# Altium schematic symbol library Wurth_Elektronik_Passive_rev16a.SCHLIB: 1143 symbols (part 12 of 27)
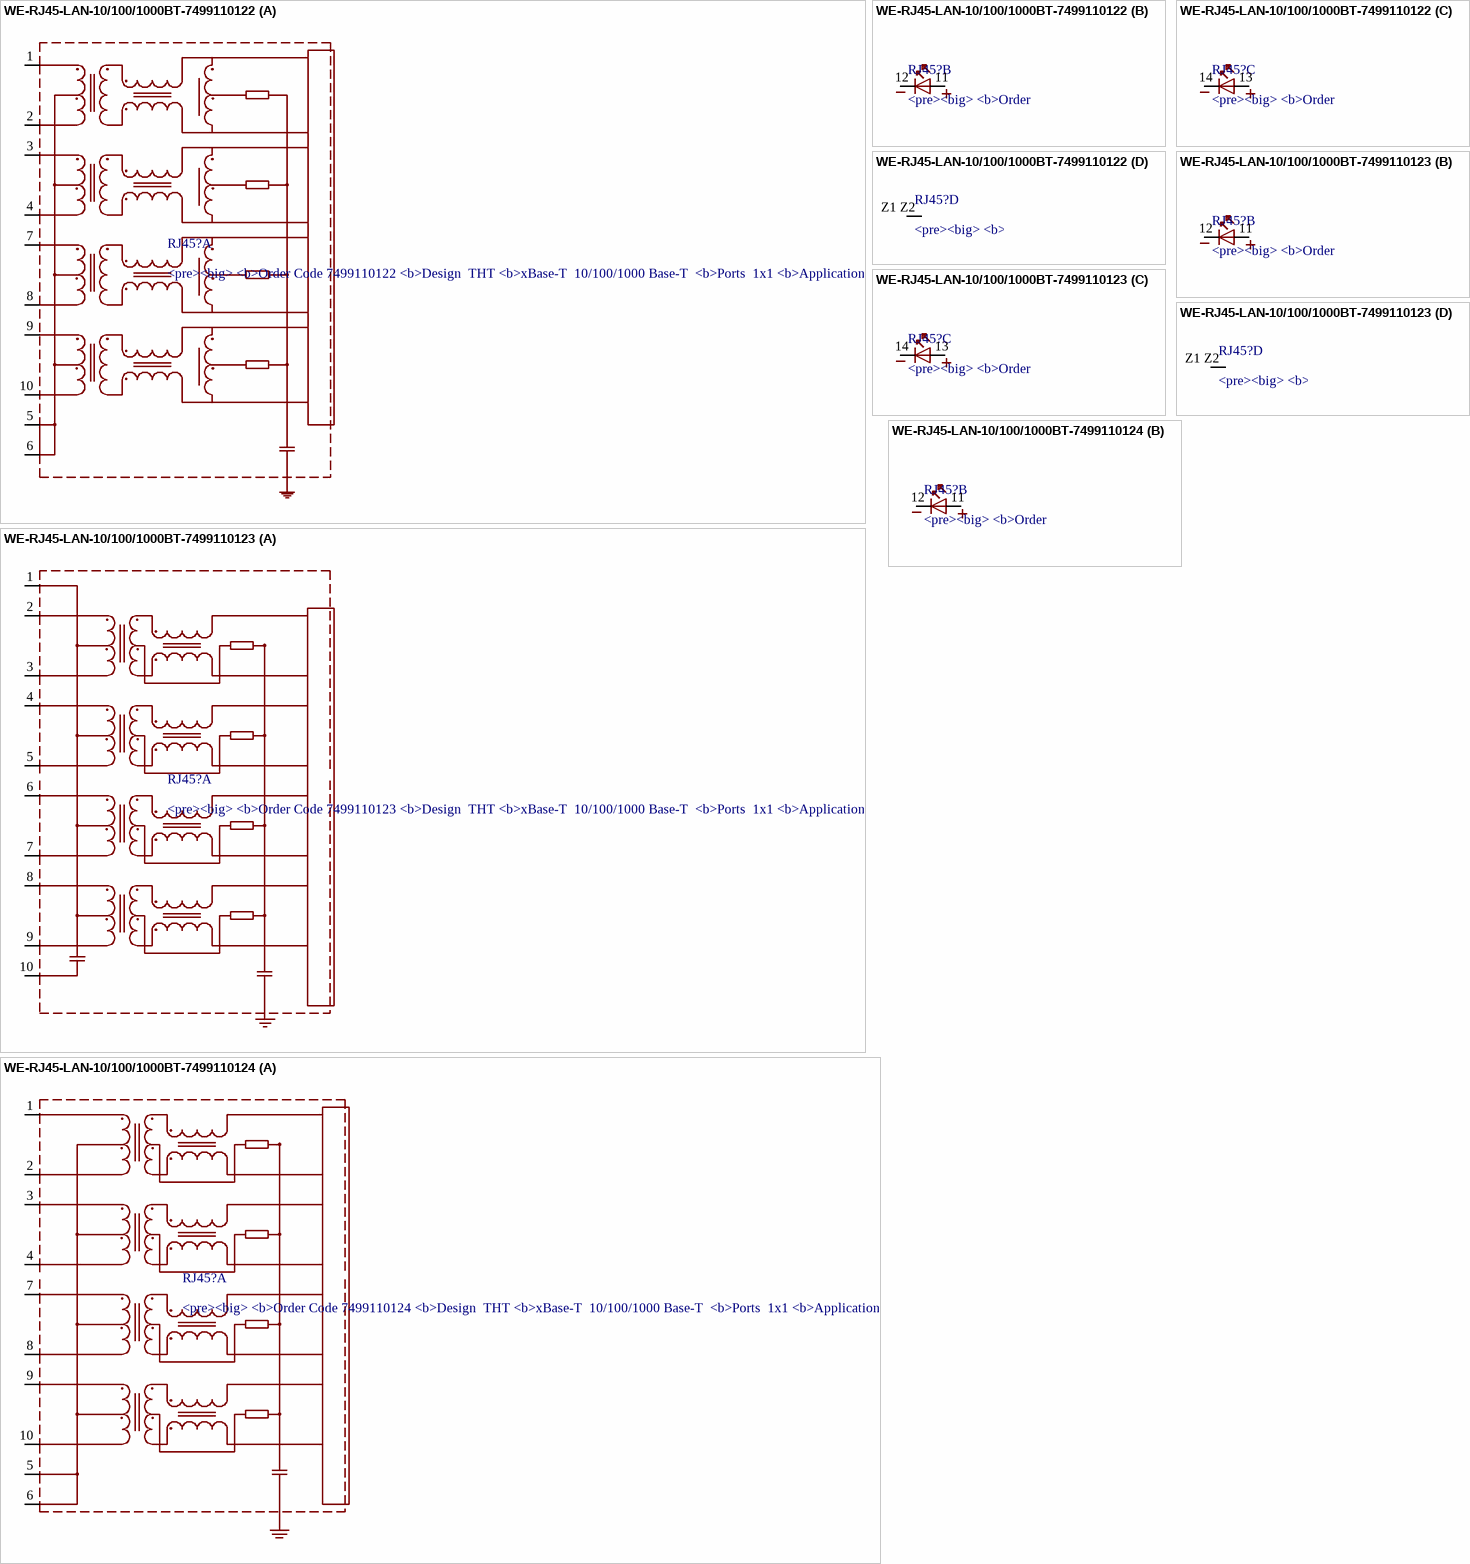
[diagram p69: symbols WE-RJ45-LAN-10/100/1000BT-7499110122 to WE-RJ45-LAN-10/100/1000BT-7499110124]

## WE-RJ45-LAN-10/100/1000BT-7499110122
designator RJ45?, comment <pre><big> / <b>Order Code	7499110122 / <b>Design		THT / <b>xBase-T		10/100/1000 Base-T / <b>Ports		1x1 / <b>Application	Standard / <b>Tab Position	Down / <b>LED (Left-Right)	YELLOW-GREEN / <b>EMI Fingers	No / </b><br><a href="<br><a href="http://katalog.we-online.de/media/images/eisos/UtLAN_RJ45_pf2.jpg" title="Enlarge picture"> / <img src="http://katalog.we-online.de/media/images/eisos/UtLAN_RJ45_pf2.jpg" width="320"></a><p> / Details see: <a href="http://katalog.we-online.de/en/pbs/WE-LAN_RJ45/7499110122?">http://katalog.we-online.de/en/pbs/WE-LAN_RJ45/7499110122?</a><p> / </b> / </b>Updated  by  Dan Xu 2014-07-10<br> / </b>2014 (C) Würth Elektronik
MANUFACTURER: Würth Elektronik eiSos GmbH; CREATED-BY: Christin Zierenner; COMPANY-URL: http://www.we-online.de; CREATED-DATE: AUG 2012; DATASHEET-URL: http://katalog.we-online.de/kataloge/eisos/media/pdf/7499110122.pdf
footprint 7499110122
part A pins: 1, 2, 3, 4, 5, 6, 7, 8, 9, 10
part B pins: 11 A, 12 K
part C pins: 13 A, 14 K
part D pins: Z1 Z2 P$1 (power)

## WE-RJ45-LAN-10/100/1000BT-7499110123
designator RJ45?, comment <pre><big> / <b>Order Code	7499110123 / <b>Design		THT / <b>xBase-T		10/100/1000 Base-T / <b>Ports		1x1 / <b>Application	Standard / <b>Tab Position	VERTICAL / <b>LED (Left-Right)	YELLOW-GREEN / <b>EMI Fingers	No / </b><br><a href="<br><a href="http://katalog.we-online.de/media/images/eisos/UtLAN_RJ45_pf2.jpg" title="Enlarge picture"> / <img src="http://katalog.we-online.de/media/images/eisos/UtLAN_RJ45_pf2.jpg" width="320"></a><p> / Details see: <a href="http://katalog.we-online.de/en/pbs/WE-LAN_RJ45/7499110123?">http://katalog.we-online.de/en/pbs/WE-LAN_RJ45/7499110123?</a><p> / </b> / </b>Updated  by  Dan Xu 2014-07-10<br> / </b>2014 (C) Würth Elektronik
MANUFACTURER: Würth Elektronik eiSos GmbH; CREATED-BY: Christin Zierenner; COMPANY-URL: http://www.we-online.de; CREATED-DATE: AUG 2012; DATASHEET-URL: http://katalog.we-online.de/kataloge/eisos/media/pdf/7499110123.pdf
footprint 7499110123
part A pins: 1, 2, 3, 4, 5, 6, 7, 8, 9, 10
part B pins: 11 A, 12 K
part C pins: 13 A, 14 K
part D pins: Z1 Z2 P$1 (power)

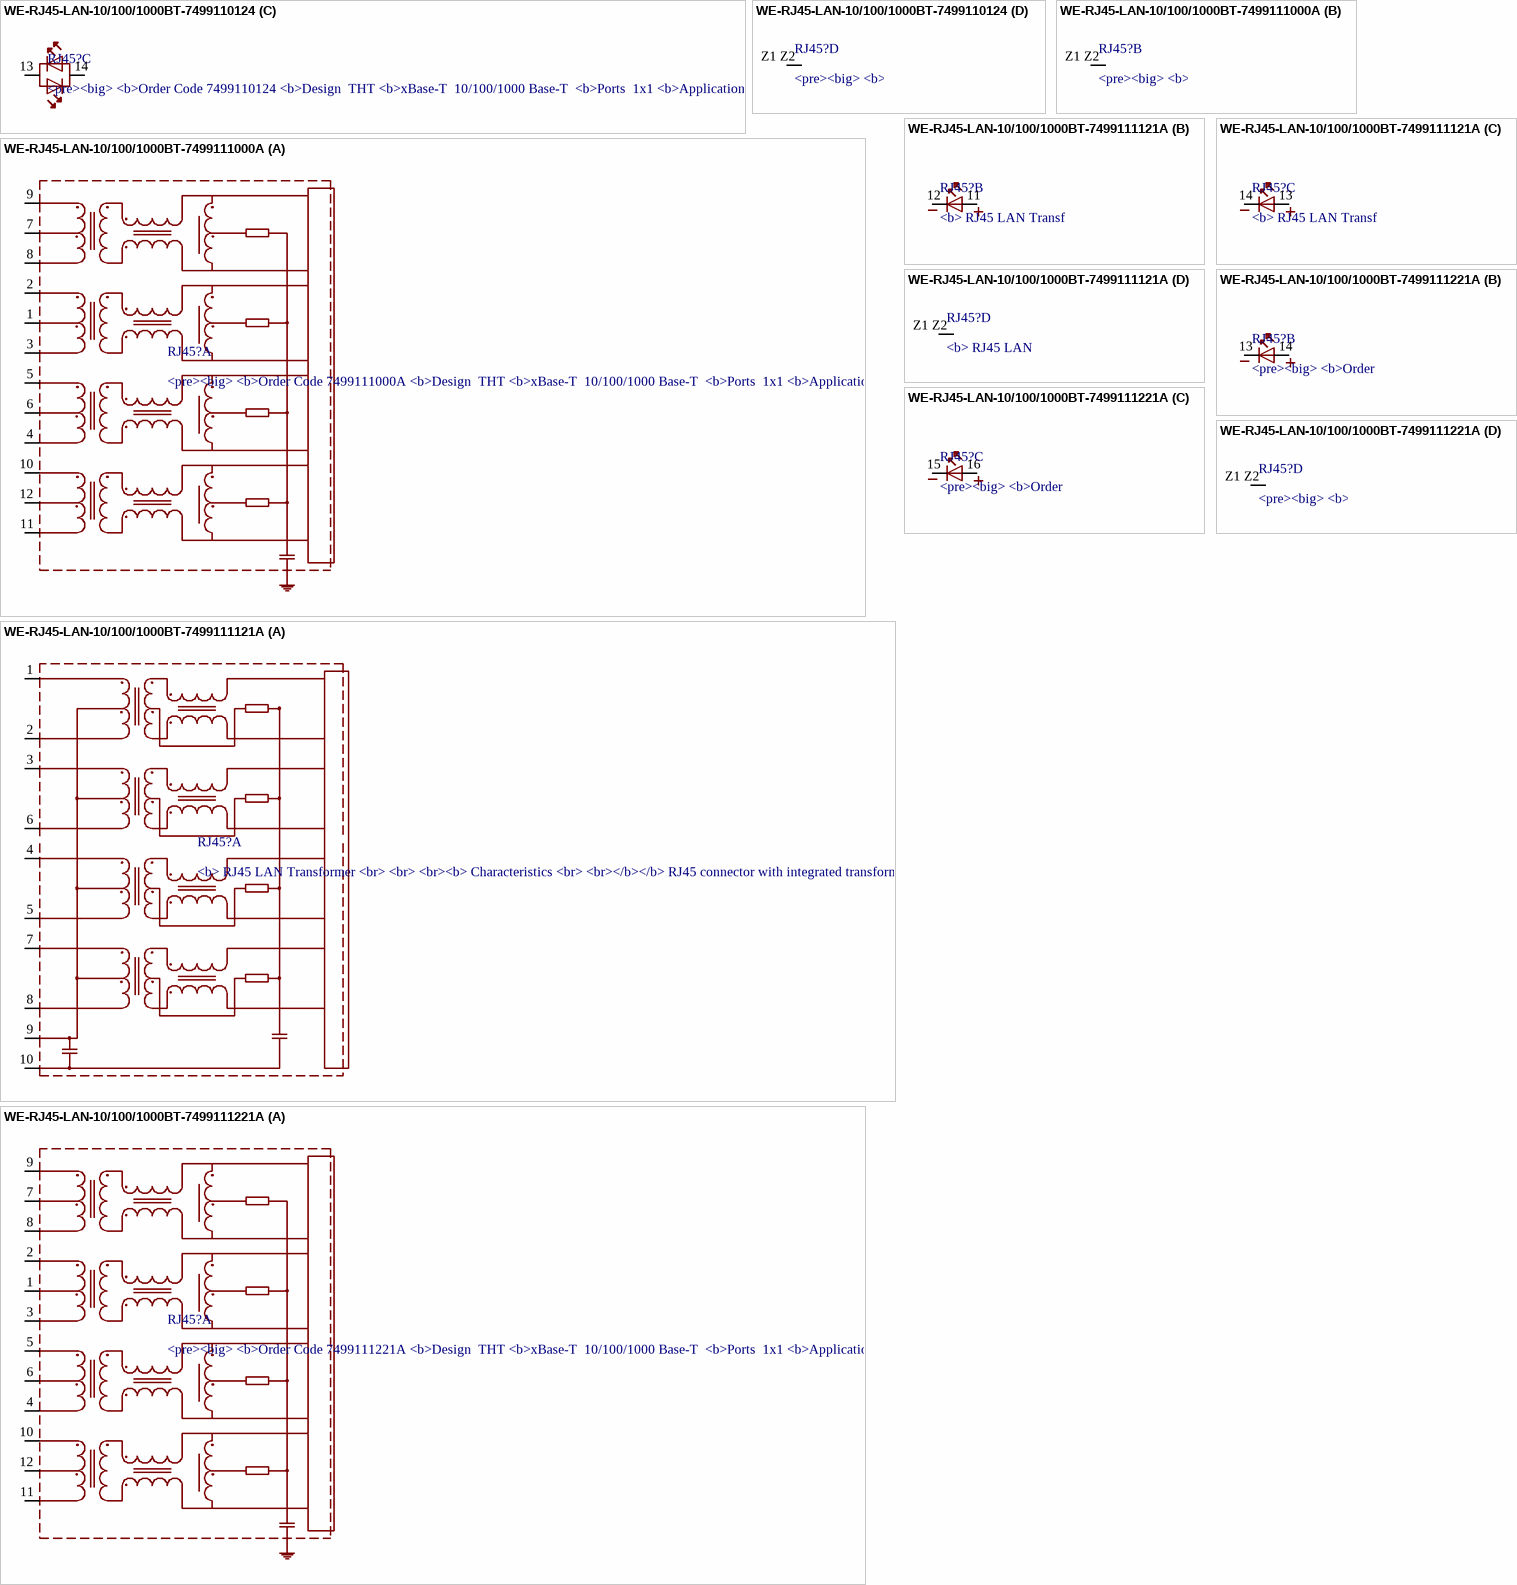
[diagram p29: symbols WE-RJ45-LAN-10/100/1000BT-7499110124 to WE-RJ45-LAN-10/100/1000BT-7499111221A]

## WE-RJ45-LAN-10/100/1000BT-7499110124
designator RJ45?, comment <pre><big> / <b>Order Code	7499110124 / <b>Design		THT / <b>xBase-T		10/100/1000 Base-T / <b>Ports		1x1 / <b>Application	Standard / <b>Tab Position	UP / <b>LED (Left-Right)	GREEN/YELLOW-GREEN / <b>EMI Fingers	No / </b><br><a href="<br><a href="http://katalog.we-online.de/media/images/eisos/UtLAN_RJ45_pf2.jpg" title="Enlarge picture"> / <img src="http://katalog.we-online.de/media/images/eisos/UtLAN_RJ45_pf2.jpg" width="320"></a><p> / Details see: <a href="http://katalog.we-online.de/en/pbs/WE-LAN_RJ45/7499110124?">http://katalog.we-online.de/en/pbs/WE-LAN_RJ45/7499110124?</a><p> / </b> / </b>Updated  by  Dan Xu 2014-07-10<br> / </b>2014 (C) Würth Elektronik
MANUFACTURER: Würth Elektronik eiSos GmbH; CREATED-BY: Christin Zierenner; COMPANY-URL: http://www.we-online.de; CREATED-DATE: AUG 2012; DATASHEET-URL: http://katalog.we-online.de/kataloge/eisos/media/pdf/7499110124.pdf
footprint 7499110124
part A pins: 1, 2, 3, 4, 5, 6, 7, 8, 9, 10
part B pins: 11 A, 12 K
part C pins: 13 AK1, 14 AK2
part D pins: Z1 Z2 P$1 (power)

## WE-RJ45-LAN-10/100/1000BT-7499111000A
designator RJ45?, comment <pre><big> / <b>Order Code	7499111000A / <b>Design		THT / <b>xBase-T		10/100/1000 Base-T / <b>Ports		1x1 / <b>Application	Standard / <b>Tab Position	UP / <b>LED (Left-Right)	NONE / <b>EMI Fingers	Yes / </b><br><a href="<br><a href="http://katalog.we-online.de/media/images/eisos/UtLAN_RJ45_pf2.jpg" title="Enlarge picture"> / <img src="http://katalog.we-online.de/media/images/eisos/UtLAN_RJ45_pf2.jpg" width="320"></a><p> / Details see: <a href="http://katalog.we-online.de/en/pbs/WE-LAN_RJ45/7499111000A?">http://katalog.we-online.de/en/pbs/WE-LAN_RJ45/7499111000A?</a><p> / </b> / </b>Updated  by  Dan Xu 2014-07-10<br> / </b>2014 (C) Würth Elektronik
MANUFACTURER: Würth Elektronik eiSos GmbH; CREATED-BY: Christin Zierenner; COMPANY-URL: http://www.we-online.de; CREATED-DATE: AUG 2012; DATASHEET-URL: http://katalog.we-online.de/kataloge/eisos/media/pdf/7499111000A.pdf
footprint 7499111000A
part A pins: 1, 2, 3, 4, 5, 6, 7, 8, 9, 10, 11, 12
part B pins: Z1 Z2 P$1 (power)

## WE-RJ45-LAN-10/100/1000BT-7499111121A
designator RJ45?, comment <b> RJ45 LAN Transformer / <br> / <br> / <br><b> Characteristics / <br> / <br></b></b> RJ45 connector with integrated transformer common mode choke / <br> / <br> Available in SMD, THT and THT with USB / <br> / <br> 350 μH min. OCL with 8 mA bias / <br> / <br> Complies with IEEE 802.3 / <br> / <br> Extended temperature range from –40 °C to +85 °C available / <br> / <br> PoE/PoE+ / <br> / <br> / <br><b> Applications / <br> / <br></b> XDSL Modems / <br> / <br> Embedded PC / <br> / <br> LAN network applications / <br> / <br> Hub, Router, Switches / <br> / <br> / <br> / <br><a href="<br><a href="http://katalog.we-online.de/media/images/eisos/UtLAN_RJ45_pf2.jpg" title="Enlarge picture"> / <img src="http://katalog.we-online.de/media/images/eisos/UtLAN_RJ45_pf2.jpg" width="320"></a><p> / Details see: <a href="http://katalog.we-online.de/en/pbs/WE-LAN_RJ45/7499010441?">http://katalog.we-online.de/en/pbs/WE-LAN_RJ45/7499010441?</a><p> / Updated  by  Dan Xu 2014-07-08<br> / 2014 (C) Wurth Elektronik
MANUFACTURER: Würth Elektronik eiSos GmbH; CREATED-BY: Christin Zierenner; COMPANY-URL: http://www.we-online.de; CREATED-DATE: AUG 2012; DATASHEET-URL: http://katalog.we-online.de/kataloge/eisos/media/pdf/7499111121A.pdf
footprint 7499111121A
part A pins: 1, 2, 3, 4, 5, 6, 7, 8, 9 (power), 10 (power)
part B pins: 11 A, 12 K
part C pins: 13 A, 14 K
part D pins: Z1 Z2 P$1 (power)

## WE-RJ45-LAN-10/100/1000BT-7499111221A
designator RJ45?, comment <pre><big> / <b>Order Code	7499111221A / <b>Design		THT / <b>xBase-T		10/100/1000 Base-T / <b>Ports		1x1 / <b>Application	Standard / <b>Tab Position	UP / <b>LED (Left-Right)	GREEN-GREEN / <b>EMI Fingers	Yes / </b><br><a href="<br><a href="http://katalog.we-online.de/media/images/eisos/UtLAN_RJ45_pf2.jpg" title="Enlarge picture"> / <img src="http://katalog.we-online.de/media/images/eisos/UtLAN_RJ45_pf2.jpg" width="320"></a><p> / Details see: <a href="http://katalog.we-online.de/en/pbs/WE-LAN_RJ45/7499111221A?">http://katalog.we-online.de/en/pbs/WE-LAN_RJ45/7499111221A?</a><p> / </b> / </b>Updated  by  Dan Xu 2014-07-10<br> / </b>2014 (C) Würth Elektronik
MANUFACTURER: Würth Elektronik eiSos GmbH; CREATED-BY: Christin Zierenner; COMPANY-URL: http://www.we-online.de; CREATED-DATE: AUG 2012; DATASHEET-URL: http://katalog.we-online.de/kataloge/eisos/media/pdf/7499111221A.pdf
footprint 7499111221A
part A pins: 1, 2, 3, 4, 5, 6, 7, 8, 9, 10, 11, 12
part B pins: 13 K, 14 A
part C pins: 15 K, 16 A
part D pins: Z1 Z2 P$1 (power)

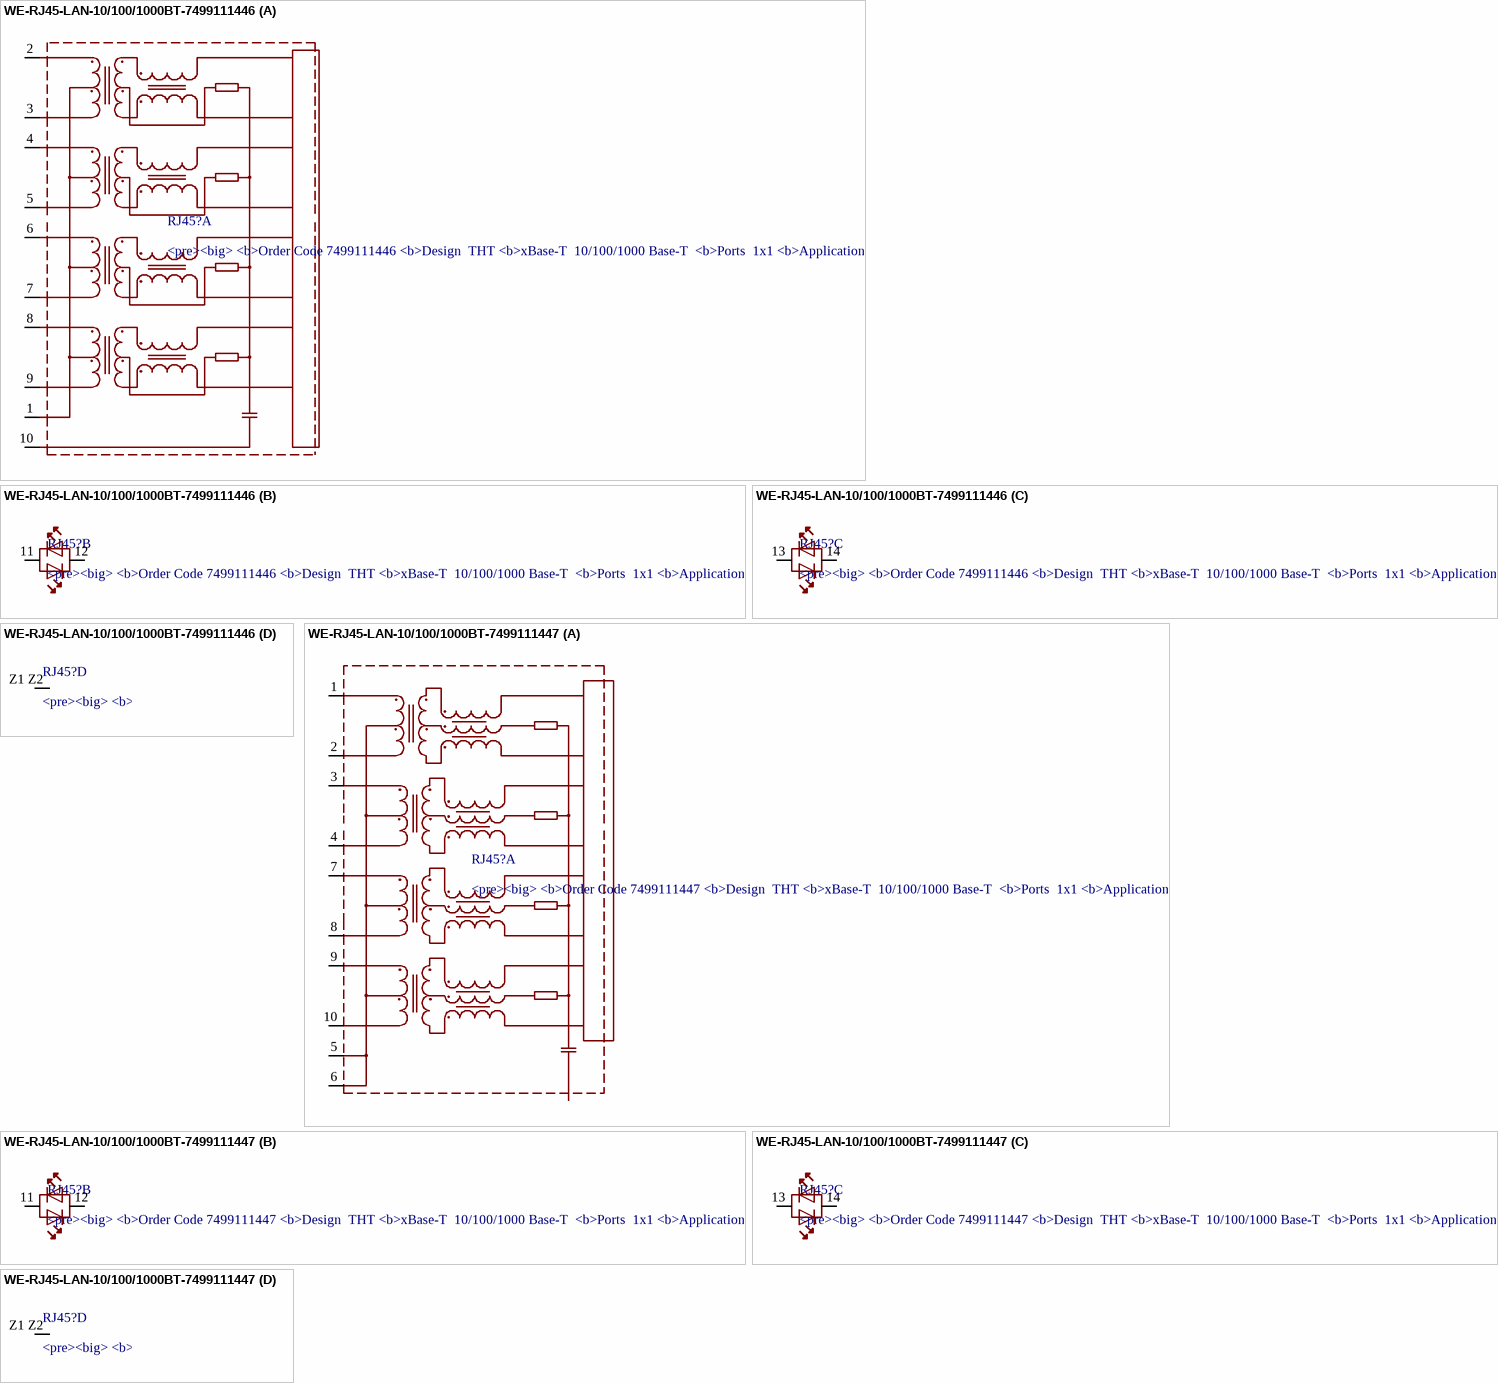
[diagram p30: symbols WE-RJ45-LAN-10/100/1000BT-7499111446 to WE-RJ45-LAN-10/100/1000BT-7499111447]

## WE-RJ45-LAN-10/100/1000BT-7499111446
designator RJ45?, comment <pre><big> / <b>Order Code	7499111446 / <b>Design		THT / <b>xBase-T		10/100/1000 Base-T / <b>Ports		1x1 / <b>Application	Standard / <b>Tab Position	DOWN / <b>LED (Left-Right)	GREEN/YELLOW-GREEN/YELLOW / <b>EMI Fingers	yes / </b><br><a href="<br><a href="http://katalog.we-online.de/media/images/eisos/UtLAN_RJ45_pf2.jpg" title="Enlarge picture"> / <img src="http://katalog.we-online.de/media/images/eisos/UtLAN_RJ45_pf2.jpg" width="320"></a><p> / Details see: <a href="http://katalog.we-online.de/en/pbs/WE-LAN_RJ45/7499111446?">http://katalog.we-online.de/en/pbs/WE-LAN_RJ45/7499111446?</a><p> / </b> / </b>Updated  by  Dan Xu 2014-07-10<br> / </b>2014 (C) Würth Elektronik
MANUFACTURER: Würth Elektronik eiSos GmbH; CREATED-BY: Christin Zierenner; COMPANY-URL: http://www.we-online.de; CREATED-DATE: AUG 2012; DATASHEET-URL: http://katalog.we-online.de/kataloge/eisos/media/pdf/7499111446.pdf
footprint 7499111446
part A pins: 1, 2, 3, 4, 5, 6, 7, 8, 9, 10 (power)
part B pins: 11 AK1, 12 AK2
part C pins: 13 AK1, 14 AK2
part D pins: Z1 Z2 P$1 (power)

## WE-RJ45-LAN-10/100/1000BT-7499111447
designator RJ45?, comment <pre><big> / <b>Order Code	7499111447 / <b>Design		THT / <b>xBase-T		10/100/1000 Base-T / <b>Ports		1x1 / <b>Application	Standard / <b>Tab Position	Up / <b>LED (Left-Right)	GREEN/YELLOW-GREEN/YELLOW / <b>EMI Fingers	yes / </b><br><a href="<br><a href="http://katalog.we-online.de/media/images/eisos/UtLAN_RJ45_pf2.jpg" title="Enlarge picture"> / <img src="http://katalog.we-online.de/media/images/eisos/UtLAN_RJ45_pf2.jpg" width="320"></a><p> / Details see: <a href="http://katalog.we-online.de/en/pbs/WE-LAN_RJ45/7499111447?">http://katalog.we-online.de/en/pbs/WE-LAN_RJ45/7499111447?</a><p> / </b> / </b>Updated  by  Dan Xu 2014-07-10<br> / </b>2014 (C) Würth Elektronik
MANUFACTURER: Würth Elektronik eiSos GmbH; CREATED-BY: Christin Zierenner; COMPANY-URL: http://www.we-online.de; CREATED-DATE: AUG 2012; DATASHEET-URL: http://katalog.we-online.de/kataloge/eisos/media/pdf/7499111447.pdf
footprint 7499111447
part A pins: 1, 2, 3, 4, 5, 6, 7, 8, 9, 10
part B pins: 11 AK1, 12 AK2
part C pins: 13 AK1, 14 AK2
part D pins: Z1 Z2 P$1 (power)

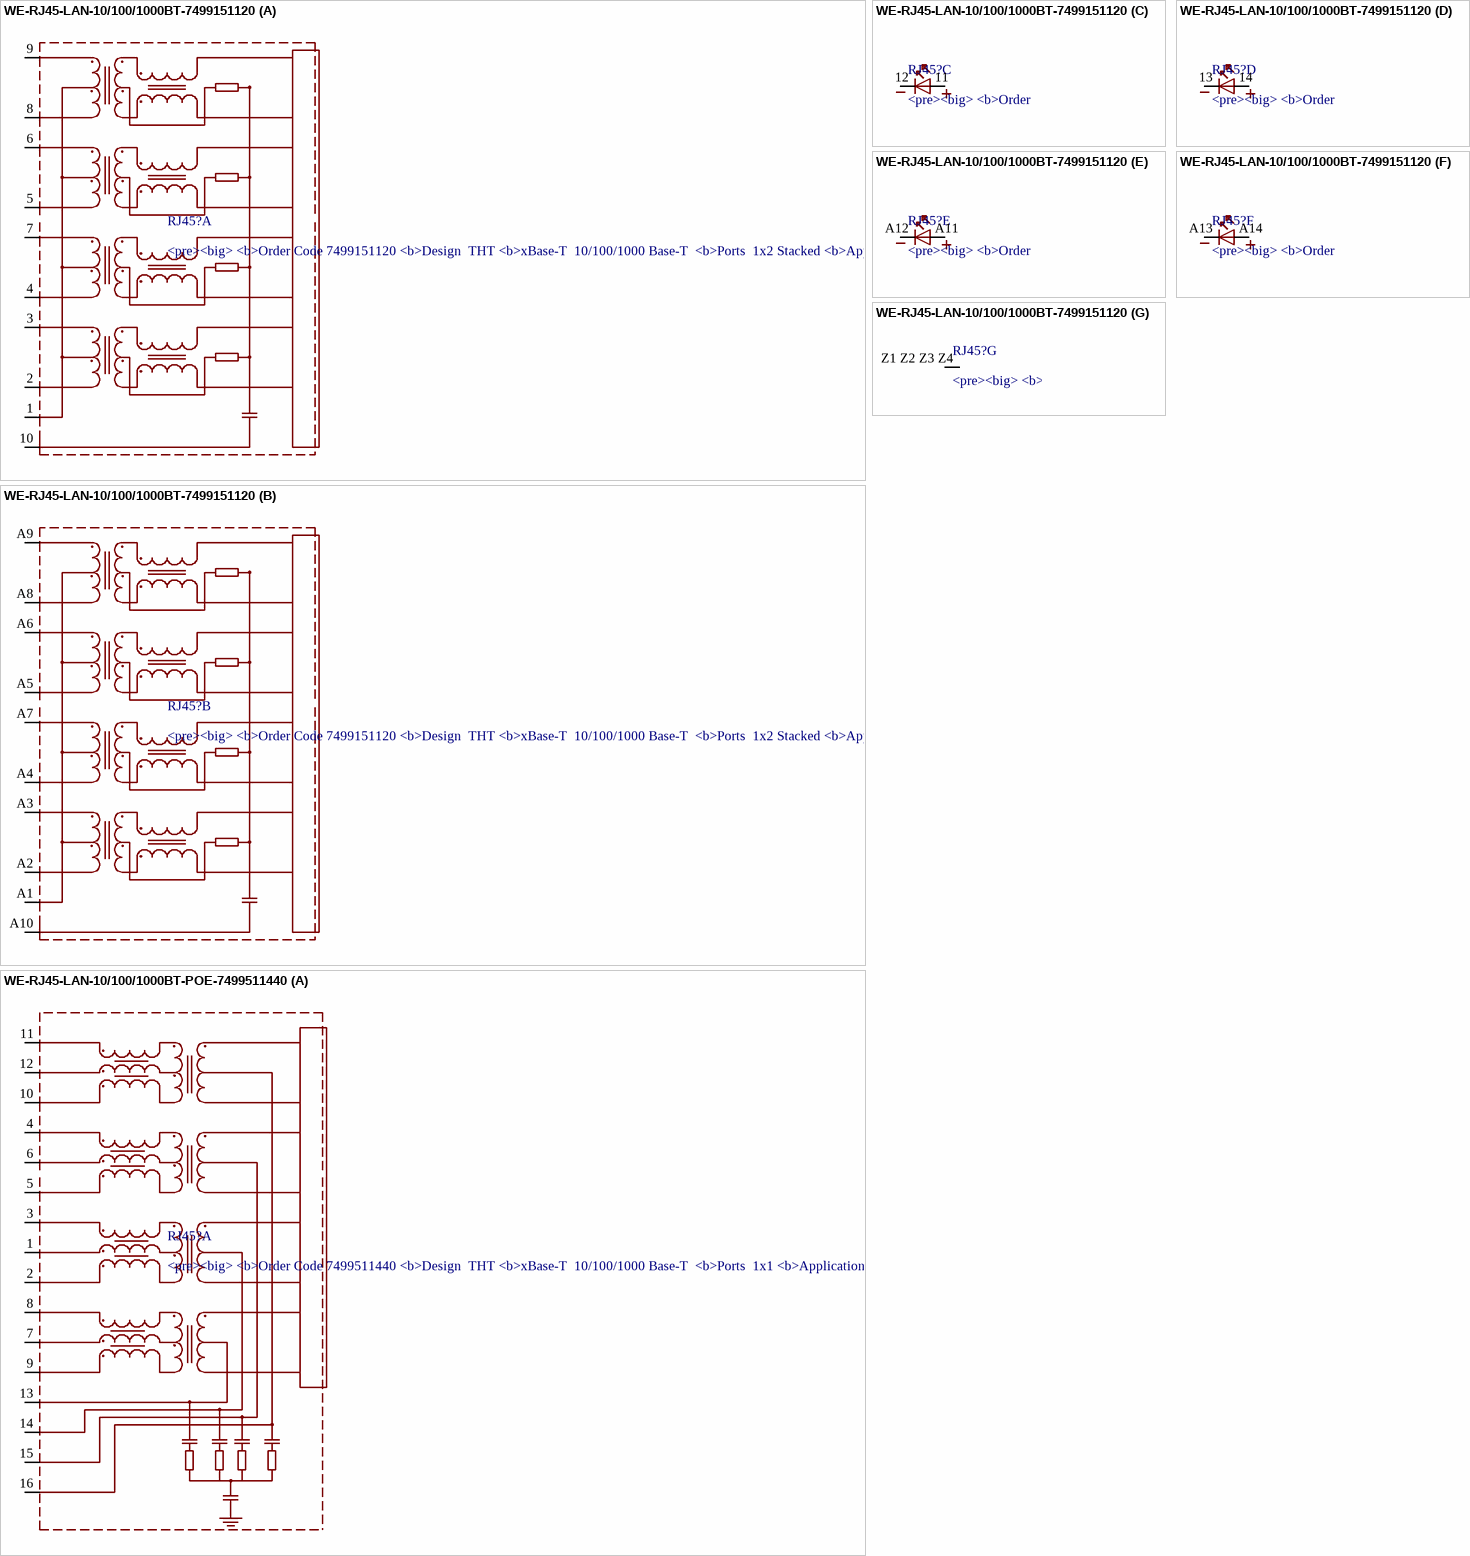
[diagram p31: symbols WE-RJ45-LAN-10/100/1000BT-7499151120 to WE-RJ45-LAN-10/100/1000BT-POE-7499511440]

## WE-RJ45-LAN-10/100/1000BT-7499151120
designator RJ45?, comment <pre><big> / <b>Order Code	7499151120 / <b>Design		THT / <b>xBase-T		10/100/1000 Base-T / <b>Ports		1x2 Stacked / <b>Application	Standard / <b>Tab Position	UP & DOWN / <b>LED (Left-Right)	YELLOW-GREEN / <b>EMI Fingers	Yes / </b><br><a href="<br><a href="http://katalog.we-online.de/media/images/eisos/UtLAN_RJ45_pf2.jpg" title="Enlarge picture"> / <img src="http://katalog.we-online.de/media/images/eisos/UtLAN_RJ45_pf2.jpg" width="320"></a><p> / Details see: <a href="http://katalog.we-online.de/en/pbs/WE-LAN_RJ45/7499151120?">http://katalog.we-online.de/en/pbs/WE-LAN_RJ45/7499151120?</a><p> / </b> / </b>Updated  by  Dan Xu 2014-07-10<br> / </b>2014 (C) Würth Elektronik
MANUFACTURER: Würth Elektronik eiSos GmbH; CREATED-BY: Christin Zierenner; COMPANY-URL: http://www.we-online.de; CREATED-DATE: AUG 2012; DATASHEET-URL: http://katalog.we-online.de/kataloge/eisos/media/pdf/7499151120.pdf
footprint 7499151120
part A pins: 1, 2, 3, 4, 5, 6, 7, 8, 9, 10 SHIELD (power)
part B pins: A1 1, A2 2, A3 3, A4 4, A5 5, A6 6, A7 7, A8 8, A9 9, A10 SHIELD (power)
part C pins: 11 A, 12 K
part D pins: 13 K, 14 A
part E pins: A11 A, A12 K
part F pins: A13 K, A14 A
part G pins: Z1 Z2 Z3 Z4 P$1 (power)

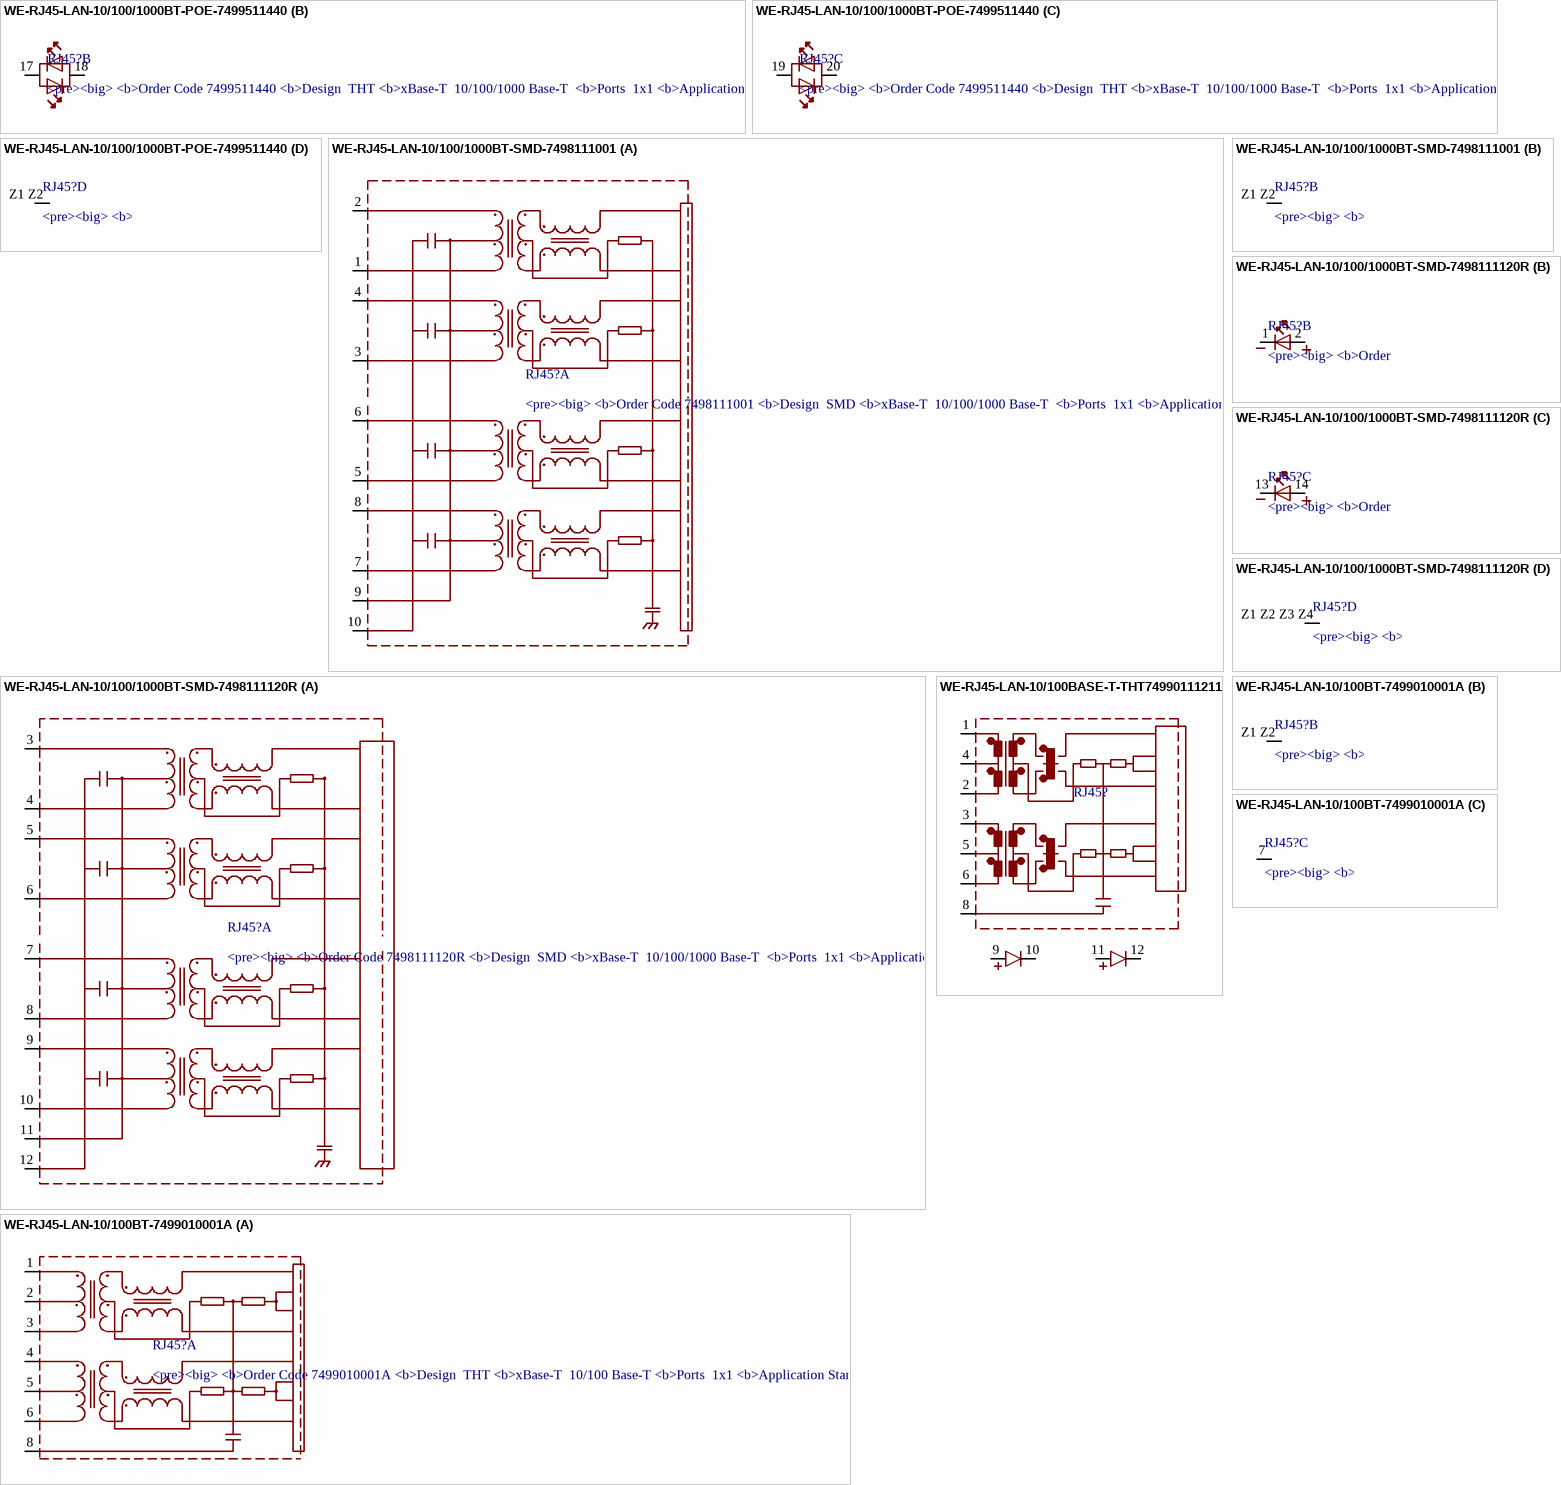
[diagram p32: symbols WE-RJ45-LAN-10/100/1000BT-POE-7499511440 to WE-RJ45-LAN-10/100BT-7499010001A]

## WE-RJ45-LAN-10/100/1000BT-POE-7499511440
designator RJ45?, comment <pre><big> / <b>Order Code	7499511440 / <b>Design		THT / <b>xBase-T		10/100/1000 Base-T / <b>Ports		1x1 / <b>Application	PoE / <b>Tab Position	UP / <b>LED (Left-Right)	GREEN/YELLOW-GREEN/YELLOW / <b>EMI Fingers	Yes / </b><br><a href="<br><a href="http://katalog.we-online.de/media/images/eisos/UtLAN_RJ45_pf2.jpg" title="Enlarge picture"> / <img src="http://katalog.we-online.de/media/images/eisos/UtLAN_RJ45_pf2.jpg" width="320"></a><p> / Details see: <a href="http://katalog.we-online.de/en/pbs/WE-LAN_RJ45/7499511440?">http://katalog.we-online.de/en/pbs/WE-LAN_RJ45/7499511440?</a><p> / </b> / </b>Updated  by  Dan Xu 2014-07-10<br> / </b>2014 (C) Würth Elektronik
MANUFACTURER: Würth Elektronik eiSos GmbH; CREATED-BY: Christin Zierenner; COMPANY-URL: http://www.we-online.de; CREATED-DATE: AUG 2012; DATASHEET-URL: http://katalog.we-online.de/kataloge/eisos/media/pdf/7499511440.pdf
footprint 7499511440
part A pins: 1, 2, 3, 4, 5, 6, 7, 8, 9, 10, 11, 12, 13 VC1+1 (power), 14 VC1-1 (power), 15 VC2+1 (power), 16 VC2-1 (power)
part B pins: 17 AK1, 18 AK2
part C pins: 19 AK1, 20 AK2
part D pins: Z1 Z2 P$1 (power)

## WE-RJ45-LAN-10/100/1000BT-SMD-7498111001
designator RJ45?, comment <pre><big> / <b>Order Code	7498111001 / <b>Design		SMD / <b>xBase-T		10/100/1000 Base-T / <b>Ports		1x1 / <b>Application	Standard / <b>Tab Position	UP / <b>LED (Left-Right)	NONE / <b>EMI Fingers	Yes / </b><br><a href="<br><a href="http://katalog.we-online.de/media/images/eisos/UtLAN_RJ45_pf2.jpg" title="Enlarge picture"> / <img src="http://katalog.we-online.de/media/images/eisos/UtLAN_RJ45_pf2.jpg" width="320"></a><p> / Details see: <a href="http://katalog.we-online.de/en/pbs/WE-LAN_RJ45/7498111001?">http://katalog.we-online.de/en/pbs/WE-LAN_RJ45/7498111001?</a><p> / </b> / </b>Updated  by  Dan Xu 2014-07-10<br> / </b>2014 (C) Würth Elektronik
MANUFACTURER: Würth Elektronik eiSos GmbH; CREATED-BY: Christin Zierenner; COMPANY-URL: http://www.we-online.de; CREATED-DATE: AUG 2012; DATASHEET-URL: http://katalog.we-online.de/kataloge/eisos/media/pdf/7498111001.pdf
footprint 7498111001
part A pins: 1, 2, 3, 4, 5, 6, 7, 8, 9 VCC (power), 10 GND (power)
part B pins: Z1 Z2 P$1 (power)

## WE-RJ45-LAN-10/100/1000BT-SMD-7498111120R
designator RJ45?, comment <pre><big> / <b>Order Code	7498111120R / <b>Design		SMD / <b>xBase-T		10/100/1000 Base-T / <b>Ports		1x1 / <b>Application	Standard / <b>Tab Position	UP / <b>LED (Left-Right)	YELLOW-GREEN / <b>EMI Fingers	Yes / </b><br><a href="<br><a href="http://katalog.we-online.de/media/images/eisos/UtLAN_RJ45_pf2.jpg" title="Enlarge picture"> / <img src="http://katalog.we-online.de/media/images/eisos/UtLAN_RJ45_pf2.jpg" width="320"></a><p> / Details see: <a href="http://katalog.we-online.de/en/pbs/WE-LAN_RJ45/7498111120R">http://katalog.we-online.de/en/pbs/WE-LAN_RJ45/7498111120R?</a><p> / </b> / </b>Updated  by  Dan Xu 2014-07-10<br> / </b>2014 (C) Würth Elektronik
MANUFACTURER: Würth Elektronik eiSos GmbH; CREATED-BY: Christin Zierenner; COMPANY-URL: http://www.we-online.de; CREATED-DATE: AUG 2012; DATASHEET-URL: http://katalog.we-online.de/kataloge/eisos/media/pdf/7498111120R.pdf
footprint 7498111120R
part A pins: 3 TRD0+, 4 TRD0-, 5 TRD1+, 6 TRD1-, 7 TRD2+, 8 TRD2-, 9 TRD3+, 10 TRD3-, 11 VCC (power), 12 GND (power)
part B pins: 1 K, 2 A
part C pins: 13 K, 14 A
part D pins: Z1 Z2 Z3 Z4 P$1 (power)

## WE-RJ45-LAN-10/100BASE-T-THT74990111211
designator RJ45?
footprint 74990111211
pins: 1, 2, 3, 4, 5, 6, 8, 9, 10, 11, 12
